# Altium schematic symbol library jlcpcb_2025_04_capacitors_extended_1210.schlib: 709 symbols (part 3 of 4)
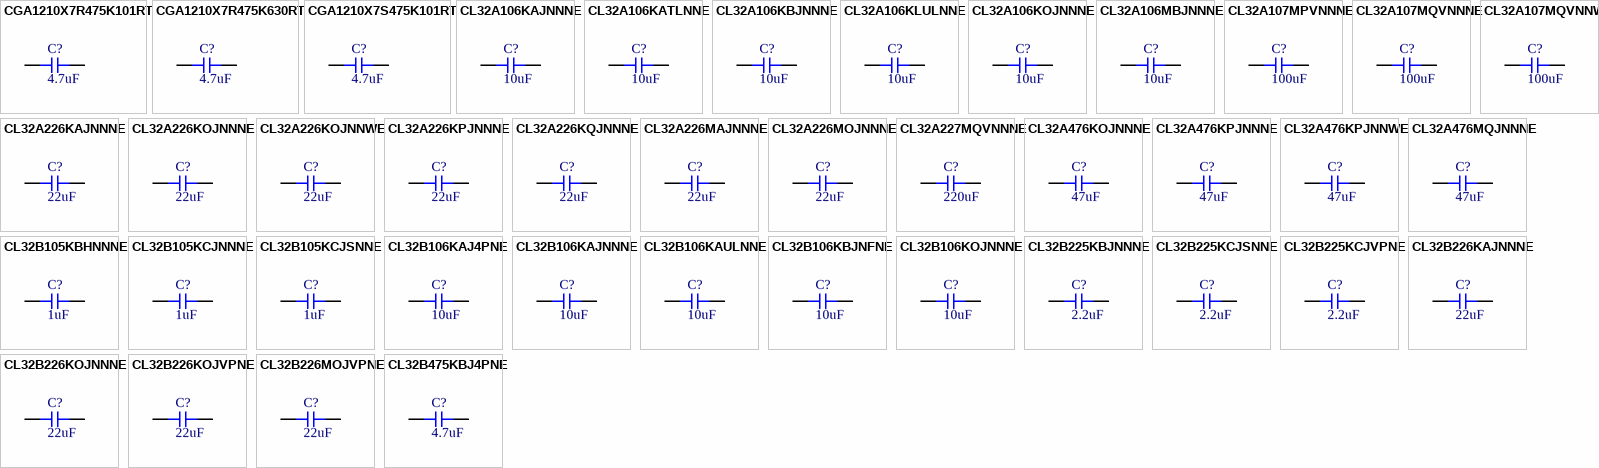
[diagram p19: symbols CGA1210X7R475K101RT to CL32B475KBJ4PNE]

## CL32A106KLULNNE
designator C?  Capacitance: 10uF  (hidden comment: *)
Capacitor, Ceramic (MLCC), 10uF, ±10%, 35V, X5R, ±10%, SMD 1210; Manufacturer: Samsung Electro-Mechanics; Manufacturer Part Number: CL32A106KLULNNE; Package Size: 1210; JLCPCB Basic Part: No; JLCPCB Part Number: C2980162; Supplier 1: LCSC; Category: Capacitors - MLCC; Supplier Part Number 1: C2980162; Tolerance: ±10%; Voltage Rating: 35V; Temperature Coefficient: X5R; RoHS: Yes; ComponentLink1Description: Datasheet; ComponentLink1URL: https://wmsc.lcsc.com/wmsc/upload/file/pdf/v2/lcsc/2203081130_Samsung-Electro-Mechanics-CL32A106KLULNNE_C2980162.pdf; ComponentLink2Description: JLCPCB Part URL; ComponentLink2URL: https://jlcpcb.com/partdetail/C2980162; ComponentLink3Description: LCSC Part URL; ComponentLink3URL: https://lcsc.com/product-detail/Multilayer-Ceramic-Capacitors-MLCC---SMD-SMT_Samsung-Electro-Mechanics-Samsung-Electro-Mechanics-CL32A106KLULNNE_C2980162.html; ComponentLink4Description: Samsung Component Library; ComponentLink4URL: https://weblib.samsungsem.com/mlcc/mlcc-ec.do?partNumber=CL32A106KLULNN
footprint CAP-1210 (1210 (3225M) Capacitor)
pins: 1, 2

## CL32A106KOJNNNE
designator C?  Capacitance: 10uF  (hidden comment: *)
Capacitor, Ceramic (MLCC), 10uF, ±10%, 16V, X5R, ±10%, SMD 1210; Manufacturer: Samsung Electro-Mechanics; Manufacturer Part Number: CL32A106KOJNNNE; Package Size: 1210; JLCPCB Basic Part: No; JLCPCB Part Number: C307584; Supplier 1: LCSC; Category: Capacitors - MLCC; Supplier Part Number 1: C307584; Tolerance: ±10%; Voltage Rating: 16V; Temperature Coefficient: X5R; RoHS: Yes; ComponentLink1Description: Datasheet; ComponentLink1URL: https://wmsc.lcsc.com/wmsc/upload/file/pdf/v2/lcsc/2304140030_Samsung-Electro-Mechanics-CL32A106KOJNNNE_C307584.pdf; ComponentLink2Description: JLCPCB Part URL; ComponentLink2URL: https://jlcpcb.com/partdetail/C307584; ComponentLink3Description: LCSC Part URL; ComponentLink3URL: https://lcsc.com/product-detail/Multilayer-Ceramic-Capacitors-MLCC---SMD-SMT_Samsung-Electro-Mechanics-Samsung-Electro-Mechanics-CL32A106KOJNNNE_C307584.html; ComponentLink4Description: Samsung Component Library; ComponentLink4URL: https://weblib.samsungsem.com/mlcc/mlcc-ec.do?partNumber=CL32A106KOJNNN
footprint CAP-1210 (1210 (3225M) Capacitor)
pins: 1, 2

## CL32A106MBJNNNE
designator C?  Capacitance: 10uF  (hidden comment: *)
Capacitor, Ceramic (MLCC), 10uF, ±20%, 50V, X5R, ±20%, SMD 1210; Manufacturer: Samsung Electro-Mechanics; Manufacturer Part Number: CL32A106MBJNNNE; Package Size: 1210; JLCPCB Basic Part: No; JLCPCB Part Number: C730495; Supplier 1: LCSC; Category: Capacitors - MLCC; Supplier Part Number 1: C730495; Tolerance: ±20%; Voltage Rating: 50V; Temperature Coefficient: X5R; RoHS: Yes; ComponentLink1Description: Datasheet; ComponentLink1URL: https://wmsc.lcsc.com/wmsc/upload/file/pdf/v2/lcsc/2008252037_Samsung-Electro-Mechanics-CL32A106MBJNNNE_C730495.pdf; ComponentLink2Description: JLCPCB Part URL; ComponentLink2URL: https://jlcpcb.com/partdetail/C730495; ComponentLink3Description: LCSC Part URL; ComponentLink3URL: https://lcsc.com/product-detail/Multilayer-Ceramic-Capacitors-MLCC---SMD-SMT_Samsung-Electro-Mechanics-Samsung-Electro-Mechanics-CL32A106MBJNNNE_C730495.html; ComponentLink4Description: Samsung Component Library; ComponentLink4URL: https://weblib.samsungsem.com/mlcc/mlcc-ec.do?partNumber=CL32A106MBJNNN
footprint CAP-1210 (1210 (3225M) Capacitor)
pins: 1, 2

## CL32A107MPVNNNE
designator C?  Capacitance: 100uF  (hidden comment: *)
Capacitor, Ceramic (MLCC), 100uF, ±20%, 10V, X5R, ±20%, SMD 1210; Manufacturer: Samsung Electro-Mechanics; Manufacturer Part Number: CL32A107MPVNNNE; Package Size: 1210; JLCPCB Basic Part: No; JLCPCB Part Number: C23742; Supplier 1: LCSC; Category: Capacitors - MLCC; Supplier Part Number 1: C23742; Tolerance: ±20%; Voltage Rating: 10V; Temperature Coefficient: X5R; RoHS: Yes; ComponentLink1Description: Datasheet; ComponentLink1URL: https://wmsc.lcsc.com/wmsc/upload/file/pdf/v2/lcsc/2304140030_Samsung-Electro-Mechanics-CL32A107MPVNNNE_C23742.pdf; ComponentLink2Description: JLCPCB Part URL; ComponentLink2URL: https://jlcpcb.com/partdetail/C23742; ComponentLink3Description: LCSC Part URL; ComponentLink3URL: https://lcsc.com/product-detail/Multilayer-Ceramic-Capacitors-MLCC---SMD-SMT_Samsung-Electro-Mechanics-Samsung-Electro-Mechanics-CL32A107MPVNNNE_C23742.html; ComponentLink4Description: Samsung Component Library; ComponentLink4URL: https://weblib.samsungsem.com/mlcc/mlcc-ec.do?partNumber=CL32A107MPVNNN
footprint CAP-1210 (1210 (3225M) Capacitor)
pins: 1, 2

## CL32A107MQVNNNE
designator C?  Capacitance: 100uF  (hidden comment: *)
Capacitor, Ceramic (MLCC), 100uF, ±20%, 6.3V, X5R, ±20%, SMD 1210; Manufacturer: Samsung Electro-Mechanics; Manufacturer Part Number: CL32A107MQVNNNE; Package Size: 1210; JLCPCB Basic Part: No; JLCPCB Part Number: C49066; Supplier 1: LCSC; Category: Capacitors - MLCC; Supplier Part Number 1: C49066; Tolerance: ±20%; Voltage Rating: 6.3V; Temperature Coefficient: X5R; RoHS: Yes; ComponentLink1Description: Datasheet; ComponentLink1URL: https://wmsc.lcsc.com/wmsc/upload/file/pdf/v2/lcsc/2304140030_Samsung-Electro-Mechanics-CL32A107MQVNNNE_C49066.pdf; ComponentLink2Description: JLCPCB Part URL; ComponentLink2URL: https://jlcpcb.com/partdetail/C49066; ComponentLink3Description: LCSC Part URL; ComponentLink3URL: https://lcsc.com/product-detail/Multilayer-Ceramic-Capacitors-MLCC---SMD-SMT_Samsung-Electro-Mechanics-Samsung-Electro-Mechanics-CL32A107MQVNNNE_C49066.html; ComponentLink4Description: Samsung Component Library; ComponentLink4URL: https://weblib.samsungsem.com/mlcc/mlcc-ec.do?partNumber=CL32A107MQVNNN
footprint CAP-1210 (1210 (3225M) Capacitor)
pins: 1, 2

## CL32A107MQVNNWE
designator C?  Capacitance: 100uF  (hidden comment: *)
Capacitor, Ceramic (MLCC), 100uF, ±20%, 6.3V, X5R, ±20%, SMD 1210; Manufacturer: Samsung Electro-Mechanics; Manufacturer Part Number: CL32A107MQVNNWE; Package Size: 1210; JLCPCB Basic Part: No; JLCPCB Part Number: C16196520; Supplier 1: LCSC; Category: Capacitors - MLCC; Supplier Part Number 1: C16196520; Tolerance: ±20%; Voltage Rating: 6.3V; Temperature Coefficient: X5R; RoHS: Yes; ComponentLink1Description: Datasheet; ComponentLink1URL: https://wmsc.lcsc.com/wmsc/upload/file/pdf/v2/lcsc/2309060914_Samsung-Electro-Mechanics-CL32A107MQVNNWE_C16196520.pdf; ComponentLink2Description: JLCPCB Part URL; ComponentLink2URL: https://jlcpcb.com/partdetail/C16196520; ComponentLink3Description: LCSC Part URL; ComponentLink3URL: https://lcsc.com/product-detail/Multilayer-Ceramic-Capacitors-MLCC---SMD-SMT_Samsung-Electro-Mechanics-Samsung-Electro-Mechanics-CL32A107MQVNNWE_C16196520.html; ComponentLink4Description: Samsung Component Library; ComponentLink4URL: https://weblib.samsungsem.com/mlcc/mlcc-ec.do?partNumber=CL32A107MQVNNW
footprint CAP-1210 (1210 (3225M) Capacitor)
pins: 1, 2

## CL32A226KAJNNNE
designator C?  Capacitance: 22uF  (hidden comment: *)
Capacitor, Ceramic (MLCC), 22uF, ±10%, 25V, X5R, ±10%, SMD 1210; Manufacturer: Samsung Electro-Mechanics; Manufacturer Part Number: CL32A226KAJNNNE; Package Size: 1210; JLCPCB Basic Part: No; JLCPCB Part Number: C52306; Supplier 1: LCSC; Category: Capacitors - MLCC; Supplier Part Number 1: C52306; Tolerance: ±10%; Voltage Rating: 25V; Temperature Coefficient: X5R; RoHS: Yes; ComponentLink1Description: Datasheet; ComponentLink1URL: https://wmsc.lcsc.com/wmsc/upload/file/pdf/v2/lcsc/2304140030_Samsung-Electro-Mechanics-CL32A226KAJNNNE_C52306.pdf; ComponentLink2Description: JLCPCB Part URL; ComponentLink2URL: https://jlcpcb.com/partdetail/C52306; ComponentLink3Description: LCSC Part URL; ComponentLink3URL: https://lcsc.com/product-detail/Multilayer-Ceramic-Capacitors-MLCC---SMD-SMT_Samsung-Electro-Mechanics-Samsung-Electro-Mechanics-CL32A226KAJNNNE_C52306.html; ComponentLink4Description: Samsung Component Library; ComponentLink4URL: https://weblib.samsungsem.com/mlcc/mlcc-ec.do?partNumber=CL32A226KAJNNN
footprint CAP-1210 (1210 (3225M) Capacitor)
pins: 1, 2

## CL32A226KOJNNNE
designator C?  Capacitance: 22uF  (hidden comment: *)
Capacitor, Ceramic (MLCC), 22uF, ±10%, 16V, X5R, ±10%, SMD 1210; Manufacturer: Samsung Electro-Mechanics; Manufacturer Part Number: CL32A226KOJNNNE; Package Size: 1210; JLCPCB Basic Part: No; JLCPCB Part Number: C19659; Supplier 1: LCSC; Category: Capacitors - MLCC; Supplier Part Number 1: C19659; Tolerance: ±10%; Voltage Rating: 16V; Temperature Coefficient: X5R; RoHS: Yes; ComponentLink1Description: Datasheet; ComponentLink1URL: https://wmsc.lcsc.com/wmsc/upload/file/pdf/v2/lcsc/2304140030_Samsung-Electro-Mechanics-CL32A226KOJNNNE_C19659.pdf; ComponentLink2Description: JLCPCB Part URL; ComponentLink2URL: https://jlcpcb.com/partdetail/C19659; ComponentLink3Description: LCSC Part URL; ComponentLink3URL: https://lcsc.com/product-detail/Multilayer-Ceramic-Capacitors-MLCC---SMD-SMT_Samsung-Electro-Mechanics-Samsung-Electro-Mechanics-CL32A226KOJNNNE_C19659.html; ComponentLink4Description: Samsung Component Library; ComponentLink4URL: https://weblib.samsungsem.com/mlcc/mlcc-ec.do?partNumber=CL32A226KOJNNN
footprint CAP-1210 (1210 (3225M) Capacitor)
pins: 1, 2

## CL32A226KOJNNWE
designator C?  Capacitance: 22uF  (hidden comment: *)
Capacitor, Ceramic (MLCC), 22uF, ±10%, 16V, X5R, ±10%, SMD 1210; Manufacturer: Samsung Electro-Mechanics; Manufacturer Part Number: CL32A226KOJNNWE; Package Size: 1210; JLCPCB Basic Part: No; JLCPCB Part Number: C368810; Supplier 1: LCSC; Category: Capacitors - MLCC; Supplier Part Number 1: C368810; Tolerance: ±10%; Voltage Rating: 16V; Temperature Coefficient: X5R; RoHS: Yes; ComponentLink1Description: Datasheet; ComponentLink1URL: https://wmsc.lcsc.com/wmsc/upload/file/pdf/v2/lcsc/2304140030_Samsung-Electro-Mechanics-CL32A226KOJNNWE_C368810.pdf; ComponentLink2Description: JLCPCB Part URL; ComponentLink2URL: https://jlcpcb.com/partdetail/C368810; ComponentLink3Description: LCSC Part URL; ComponentLink3URL: https://lcsc.com/product-detail/Multilayer-Ceramic-Capacitors-MLCC---SMD-SMT_Samsung-Electro-Mechanics-Samsung-Electro-Mechanics-CL32A226KOJNNWE_C368810.html; ComponentLink4Description: Samsung Component Library; ComponentLink4URL: https://weblib.samsungsem.com/mlcc/mlcc-ec.do?partNumber=CL32A226KOJNNW
footprint CAP-1210 (1210 (3225M) Capacitor)
pins: 1, 2

## CL32A226KPJNNNE
designator C?  Capacitance: 22uF  (hidden comment: *)
Capacitor, Ceramic (MLCC), 22uF, ±10%, 10V, X5R, ±10%, SMD 1210; Manufacturer: Samsung Electro-Mechanics; Manufacturer Part Number: CL32A226KPJNNNE; Package Size: 1210; JLCPCB Basic Part: No; JLCPCB Part Number: C318780; Supplier 1: LCSC; Category: Capacitors - MLCC; Supplier Part Number 1: C318780; Tolerance: ±10%; Voltage Rating: 10V; Temperature Coefficient: X5R; RoHS: Yes; ComponentLink1Description: Datasheet; ComponentLink1URL: https://wmsc.lcsc.com/wmsc/upload/file/pdf/v2/lcsc/1912111437_Samsung-Electro-Mechanics-CL32A226KPJNNNE_C318780.pdf; ComponentLink2Description: JLCPCB Part URL; ComponentLink2URL: https://jlcpcb.com/partdetail/C318780; ComponentLink3Description: LCSC Part URL; ComponentLink3URL: https://lcsc.com/product-detail/Multilayer-Ceramic-Capacitors-MLCC---SMD-SMT_Samsung-Electro-Mechanics-Samsung-Electro-Mechanics-CL32A226KPJNNNE_C318780.html; ComponentLink4Description: Samsung Component Library; ComponentLink4URL: https://weblib.samsungsem.com/mlcc/mlcc-ec.do?partNumber=CL32A226KPJNNN
footprint CAP-1210 (1210 (3225M) Capacitor)
pins: 1, 2

## CL32A226KQJNNNE
designator C?  Capacitance: 22uF  (hidden comment: *)
Capacitor, Ceramic (MLCC), 22uF, ±10%, 6.3V, X5R, ±10%, SMD 1210; Manufacturer: Samsung Electro-Mechanics; Manufacturer Part Number: CL32A226KQJNNNE; Package Size: 1210; JLCPCB Basic Part: No; JLCPCB Part Number: C307585; Supplier 1: LCSC; Category: Capacitors - MLCC; Supplier Part Number 1: C307585; Tolerance: ±10%; Voltage Rating: 6.3V; Temperature Coefficient: X5R; RoHS: Yes; ComponentLink1Description: Datasheet; ComponentLink1URL: https://wmsc.lcsc.com/wmsc/upload/file/pdf/v2/lcsc/2304140030_Samsung-Electro-Mechanics-CL32A226KQJNNNE_C307585.pdf; ComponentLink2Description: JLCPCB Part URL; ComponentLink2URL: https://jlcpcb.com/partdetail/C307585; ComponentLink3Description: LCSC Part URL; ComponentLink3URL: https://lcsc.com/product-detail/Multilayer-Ceramic-Capacitors-MLCC---SMD-SMT_Samsung-Electro-Mechanics-Samsung-Electro-Mechanics-CL32A226KQJNNNE_C307585.html; ComponentLink4Description: Samsung Component Library; ComponentLink4URL: https://weblib.samsungsem.com/mlcc/mlcc-ec.do?partNumber=CL32A226KQJNNN
footprint CAP-1210 (1210 (3225M) Capacitor)
pins: 1, 2

## CL32A226MAJNNNE
designator C?  Capacitance: 22uF  (hidden comment: *)
Capacitor, Ceramic (MLCC), 22uF, ±20%, 25V, X5R, ±20%, SMD 1210; Manufacturer: Samsung Electro-Mechanics; Manufacturer Part Number: CL32A226MAJNNNE; Package Size: 1210; JLCPCB Basic Part: No; JLCPCB Part Number: C307586; Supplier 1: LCSC; Category: Capacitors - MLCC; Supplier Part Number 1: C307586; Tolerance: ±20%; Voltage Rating: 25V; Temperature Coefficient: X5R; RoHS: Yes; ComponentLink1Description: Datasheet; ComponentLink1URL: https://wmsc.lcsc.com/wmsc/upload/file/pdf/v2/lcsc/2304140030_Samsung-Electro-Mechanics-CL32A226MAJNNNE_C307586.pdf; ComponentLink2Description: JLCPCB Part URL; ComponentLink2URL: https://jlcpcb.com/partdetail/C307586; ComponentLink3Description: LCSC Part URL; ComponentLink3URL: https://lcsc.com/product-detail/Multilayer-Ceramic-Capacitors-MLCC---SMD-SMT_Samsung-Electro-Mechanics-Samsung-Electro-Mechanics-CL32A226MAJNNNE_C307586.html; ComponentLink4Description: Samsung Component Library; ComponentLink4URL: https://weblib.samsungsem.com/mlcc/mlcc-ec.do?partNumber=CL32A226MAJNNN
footprint CAP-1210 (1210 (3225M) Capacitor)
pins: 1, 2

## CL32A226MOJNNNE
designator C?  Capacitance: 22uF  (hidden comment: *)
Capacitor, Ceramic (MLCC), 22uF, ±20%, 16V, X5R, ±20%, SMD 1210; Manufacturer: Samsung Electro-Mechanics; Manufacturer Part Number: CL32A226MOJNNNE; Package Size: 1210; JLCPCB Basic Part: No; JLCPCB Part Number: C100086; Supplier 1: LCSC; Category: Capacitors - MLCC; Supplier Part Number 1: C100086; Tolerance: ±20%; Voltage Rating: 16V; Temperature Coefficient: X5R; RoHS: Yes; ComponentLink1Description: Datasheet; ComponentLink1URL: https://wmsc.lcsc.com/wmsc/upload/file/pdf/v2/lcsc/2304140030_Samsung-Electro-Mechanics-CL32A226MOJNNNE_C100086.pdf; ComponentLink2Description: JLCPCB Part URL; ComponentLink2URL: https://jlcpcb.com/partdetail/C100086; ComponentLink3Description: LCSC Part URL; ComponentLink3URL: https://lcsc.com/product-detail/Multilayer-Ceramic-Capacitors-MLCC---SMD-SMT_Samsung-Electro-Mechanics-Samsung-Electro-Mechanics-CL32A226MOJNNNE_C100086.html; ComponentLink4Description: Samsung Component Library; ComponentLink4URL: https://weblib.samsungsem.com/mlcc/mlcc-ec.do?partNumber=CL32A226MOJNNN
footprint CAP-1210 (1210 (3225M) Capacitor)
pins: 1, 2

## CL32A227MQVNNNE
designator C?  Capacitance: 220uF  (hidden comment: *)
Capacitor, Ceramic (MLCC), 220uF, ±20%, 6.3V, X5R, ±20%, SMD 1210; Manufacturer: Samsung Electro-Mechanics; Manufacturer Part Number: CL32A227MQVNNNE; Package Size: 1210; JLCPCB Basic Part: No; JLCPCB Part Number: C400951; Supplier 1: LCSC; Category: Capacitors - MLCC; Supplier Part Number 1: C400951; Tolerance: ±20%; Voltage Rating: 6.3V; Temperature Coefficient: X5R; RoHS: Yes; ComponentLink1Description: Datasheet; ComponentLink1URL: https://wmsc.lcsc.com/wmsc/upload/file/pdf/v2/lcsc/2301301130_Samsung-Electro-Mechanics-CL32A227MQVNNNE_C400951.pdf; ComponentLink2Description: JLCPCB Part URL; ComponentLink2URL: https://jlcpcb.com/partdetail/C400951; ComponentLink3Description: LCSC Part URL; ComponentLink3URL: https://lcsc.com/product-detail/Multilayer-Ceramic-Capacitors-MLCC---SMD-SMT_Samsung-Electro-Mechanics-Samsung-Electro-Mechanics-CL32A227MQVNNNE_C400951.html; ComponentLink4Description: Samsung Component Library; ComponentLink4URL: https://weblib.samsungsem.com/mlcc/mlcc-ec.do?partNumber=CL32A227MQVNNN
footprint CAP-1210 (1210 (3225M) Capacitor)
pins: 1, 2

## CL32A476KOJNNNE
designator C?  Capacitance: 47uF  (hidden comment: *)
Capacitor, Ceramic (MLCC), 47uF, ±10%, 16V, X5R, ±10%, SMD 1210; Manufacturer: Samsung Electro-Mechanics; Manufacturer Part Number: CL32A476KOJNNNE; Package Size: 1210; JLCPCB Basic Part: No; JLCPCB Part Number: C2932477; Supplier 1: LCSC; Category: Capacitors - MLCC; Supplier Part Number 1: C2932477; Tolerance: ±10%; Voltage Rating: 16V; Temperature Coefficient: X5R; RoHS: Yes; ComponentLink1Description: Datasheet; ComponentLink1URL: https://wmsc.lcsc.com/wmsc/upload/file/pdf/v2/lcsc/2201121530_Samsung-Electro-Mechanics-CL32A476KOJNNNE_C2932477.pdf; ComponentLink2Description: JLCPCB Part URL; ComponentLink2URL: https://jlcpcb.com/partdetail/C2932477; ComponentLink3Description: LCSC Part URL; ComponentLink3URL: https://lcsc.com/product-detail/Multilayer-Ceramic-Capacitors-MLCC---SMD-SMT_Samsung-Electro-Mechanics-Samsung-Electro-Mechanics-CL32A476KOJNNNE_C2932477.html; ComponentLink4Description: Samsung Component Library; ComponentLink4URL: https://weblib.samsungsem.com/mlcc/mlcc-ec.do?partNumber=CL32A476KOJNNN
footprint CAP-1210 (1210 (3225M) Capacitor)
pins: 1, 2

## CL32A476KPJNNNE
designator C?  Capacitance: 47uF  (hidden comment: *)
Capacitor, Ceramic (MLCC), 47uF, ±10%, 10V, X5R, ±10%, SMD 1210; Manufacturer: Samsung Electro-Mechanics; Manufacturer Part Number: CL32A476KPJNNNE; Package Size: 1210; JLCPCB Basic Part: No; JLCPCB Part Number: C525654; Supplier 1: LCSC; Category: Capacitors - MLCC; Supplier Part Number 1: C525654; Tolerance: ±10%; Voltage Rating: 10V; Temperature Coefficient: X5R; RoHS: Yes; ComponentLink1Description: Datasheet; ComponentLink1URL: https://wmsc.lcsc.com/wmsc/upload/file/pdf/v2/lcsc/2304140030_Samsung-Electro-Mechanics-CL32A476KPJNNNE_C525654.pdf; ComponentLink2Description: JLCPCB Part URL; ComponentLink2URL: https://jlcpcb.com/partdetail/C525654; ComponentLink3Description: LCSC Part URL; ComponentLink3URL: https://lcsc.com/product-detail/Multilayer-Ceramic-Capacitors-MLCC---SMD-SMT_Samsung-Electro-Mechanics-Samsung-Electro-Mechanics-CL32A476KPJNNNE_C525654.html; ComponentLink4Description: Samsung Component Library; ComponentLink4URL: https://weblib.samsungsem.com/mlcc/mlcc-ec.do?partNumber=CL32A476KPJNNN
footprint CAP-1210 (1210 (3225M) Capacitor)
pins: 1, 2

## CL32A476KPJNNWE
designator C?  Capacitance: 47uF  (hidden comment: *)
Capacitor, Ceramic (MLCC), 47uF, ±10%, 10V, X5R, ±10%, SMD 1210; Manufacturer: Samsung Electro-Mechanics; Manufacturer Part Number: CL32A476KPJNNWE; Package Size: 1210; JLCPCB Basic Part: No; JLCPCB Part Number: C730499; Supplier 1: LCSC; Category: Capacitors - MLCC; Supplier Part Number 1: C730499; Tolerance: ±10%; Voltage Rating: 10V; Temperature Coefficient: X5R; RoHS: Yes; ComponentLink1Description: Datasheet; ComponentLink1URL: https://wmsc.lcsc.com/wmsc/upload/file/pdf/v2/lcsc/2304140030_Samsung-Electro-Mechanics-CL32A476KPJNNWE_C730499.pdf; ComponentLink2Description: JLCPCB Part URL; ComponentLink2URL: https://jlcpcb.com/partdetail/C730499; ComponentLink3Description: LCSC Part URL; ComponentLink3URL: https://lcsc.com/product-detail/Multilayer-Ceramic-Capacitors-MLCC---SMD-SMT_Samsung-Electro-Mechanics-Samsung-Electro-Mechanics-CL32A476KPJNNWE_C730499.html; ComponentLink4Description: Samsung Component Library; ComponentLink4URL: https://weblib.samsungsem.com/mlcc/mlcc-ec.do?partNumber=CL32A476KPJNNW
footprint CAP-1210 (1210 (3225M) Capacitor)
pins: 1, 2

## CL32A476MQJNNNE
designator C?  Capacitance: 47uF  (hidden comment: *)
Capacitor, Ceramic (MLCC), 47uF, ±20%, 6.3V, X5R, ±20%, SMD 1210; Manufacturer: Samsung Electro-Mechanics; Manufacturer Part Number: CL32A476MQJNNNE; Package Size: 1210; JLCPCB Basic Part: No; JLCPCB Part Number: C318779; Supplier 1: LCSC; Category: Capacitors - MLCC; Supplier Part Number 1: C318779; Tolerance: ±20%; Voltage Rating: 6.3V; Temperature Coefficient: X5R; RoHS: Yes; ComponentLink1Description: Datasheet; ComponentLink1URL: https://wmsc.lcsc.com/wmsc/upload/file/pdf/v2/lcsc/2304140030_Samsung-Electro-Mechanics-CL32A476MQJNNNE_C318779.pdf; ComponentLink2Description: JLCPCB Part URL; ComponentLink2URL: https://jlcpcb.com/partdetail/C318779; ComponentLink3Description: LCSC Part URL; ComponentLink3URL: https://lcsc.com/product-detail/Multilayer-Ceramic-Capacitors-MLCC---SMD-SMT_Samsung-Electro-Mechanics-Samsung-Electro-Mechanics-CL32A476MQJNNNE_C318779.html; ComponentLink4Description: Samsung Component Library; ComponentLink4URL: https://weblib.samsungsem.com/mlcc/mlcc-ec.do?partNumber=CL32A476MQJNNN
footprint CAP-1210 (1210 (3225M) Capacitor)
pins: 1, 2

## CL32B105KBHNNNE
designator C?  Capacitance: 1uF  (hidden comment: *)
Capacitor, Ceramic (MLCC), 1uF, ±10%, 50V, X7R, ±10%, SMD 1210; Manufacturer: Samsung Electro-Mechanics; Manufacturer Part Number: CL32B105KBHNNNE; Package Size: 1210; JLCPCB Basic Part: No; JLCPCB Part Number: C40708; Supplier 1: LCSC; Category: Capacitors - MLCC; Supplier Part Number 1: C40708; Tolerance: ±10%; Voltage Rating: 50V; Temperature Coefficient: X7R; RoHS: Yes; ComponentLink1Description: Datasheet; ComponentLink1URL: https://wmsc.lcsc.com/wmsc/upload/file/pdf/v2/lcsc/2304140030_Samsung-Electro-Mechanics-CL32B105KBHNNNE_C40708.pdf; ComponentLink2Description: JLCPCB Part URL; ComponentLink2URL: https://jlcpcb.com/partdetail/C40708; ComponentLink3Description: LCSC Part URL; ComponentLink3URL: https://lcsc.com/product-detail/Multilayer-Ceramic-Capacitors-MLCC---SMD-SMT_Samsung-Electro-Mechanics-Samsung-Electro-Mechanics-CL32B105KBHNNNE_C40708.html; ComponentLink4Description: Samsung Component Library; ComponentLink4URL: https://weblib.samsungsem.com/mlcc/mlcc-ec.do?partNumber=CL32B105KBHNNN
footprint CAP-1210 (1210 (3225M) Capacitor)
pins: 1, 2

## CL32B105KCJNNNE
designator C?  Capacitance: 1uF  (hidden comment: *)
Capacitor, Ceramic (MLCC), 1uF, ±10%, 100V, X7R, ±10%, SMD 1210; Manufacturer: Samsung Electro-Mechanics; Manufacturer Part Number: CL32B105KCJNNNE; Package Size: 1210; JLCPCB Basic Part: No; JLCPCB Part Number: C444847; Supplier 1: LCSC; Category: Capacitors - MLCC; Supplier Part Number 1: C444847; Tolerance: ±10%; Voltage Rating: 100V; Temperature Coefficient: X7R; RoHS: Yes; ComponentLink1Description: Datasheet; ComponentLink1URL: https://wmsc.lcsc.com/wmsc/upload/file/pdf/v2/lcsc/2304140030_Samsung-Electro-Mechanics-CL32B105KCJNNNE_C444847.pdf; ComponentLink2Description: JLCPCB Part URL; ComponentLink2URL: https://jlcpcb.com/partdetail/C444847; ComponentLink3Description: LCSC Part URL; ComponentLink3URL: https://lcsc.com/product-detail/Multilayer-Ceramic-Capacitors-MLCC---SMD-SMT_Samsung-Electro-Mechanics-Samsung-Electro-Mechanics-CL32B105KCJNNNE_C444847.html; ComponentLink4Description: Samsung Component Library; ComponentLink4URL: https://weblib.samsungsem.com/mlcc/mlcc-ec.do?partNumber=CL32B105KCJNNN
footprint CAP-1210 (1210 (3225M) Capacitor)
pins: 1, 2

## CL32B105KCJSNNE
designator C?  Capacitance: 1uF  (hidden comment: *)
Capacitor, Ceramic (MLCC), 1uF, ±10%, 100V, X7R, ±10%, SMD 1210; Manufacturer: Samsung Electro-Mechanics; Manufacturer Part Number: CL32B105KCJSNNE; Package Size: 1210; JLCPCB Basic Part: No; JLCPCB Part Number: C159746; Supplier 1: LCSC; Category: Capacitors - MLCC; Supplier Part Number 1: C159746; Tolerance: ±10%; Voltage Rating: 100V; Temperature Coefficient: X7R; RoHS: Yes; ComponentLink1Description: Datasheet; ComponentLink1URL: https://wmsc.lcsc.com/wmsc/upload/file/pdf/v2/lcsc/2304140030_Samsung-Electro-Mechanics-CL32B105KCJSNNE_C159746.pdf; ComponentLink2Description: JLCPCB Part URL; ComponentLink2URL: https://jlcpcb.com/partdetail/C159746; ComponentLink3Description: LCSC Part URL; ComponentLink3URL: https://lcsc.com/product-detail/Multilayer-Ceramic-Capacitors-MLCC---SMD-SMT_Samsung-Electro-Mechanics-Samsung-Electro-Mechanics-CL32B105KCJSNNE_C159746.html; ComponentLink4Description: Samsung Component Library; ComponentLink4URL: https://weblib.samsungsem.com/mlcc/mlcc-ec.do?partNumber=CL32B105KCJSNN
footprint CAP-1210 (1210 (3225M) Capacitor)
pins: 1, 2

## CL32B106KAJ4PNE
designator C?  Capacitance: 10uF  (hidden comment: *)
Capacitor, Ceramic (MLCC), 10uF, ±10%, 25V, X7R, ±10%, SMD 1210; Manufacturer: Samsung Electro-Mechanics; Manufacturer Part Number: CL32B106KAJ4PNE; Package Size: 1210; JLCPCB Basic Part: No; JLCPCB Part Number: C472857; Supplier 1: LCSC; Category: Capacitors - MLCC; Supplier Part Number 1: C472857; Tolerance: ±10%; Voltage Rating: 25V; Temperature Coefficient: X7R; RoHS: Yes; ComponentLink1Description: Datasheet; ComponentLink1URL: https://wmsc.lcsc.com/wmsc/upload/file/pdf/v2/lcsc/2304140030_Samsung-Electro-Mechanics-CL32B106KAJ4PNE_C472857.pdf; ComponentLink2Description: JLCPCB Part URL; ComponentLink2URL: https://jlcpcb.com/partdetail/C472857; ComponentLink3Description: LCSC Part URL; ComponentLink3URL: https://lcsc.com/product-detail/Multilayer-Ceramic-Capacitors-MLCC---SMD-SMT_Samsung-Electro-Mechanics-Samsung-Electro-Mechanics-CL32B106KAJ4PNE_C472857.html; ComponentLink4Description: Samsung Component Library; ComponentLink4URL: https://weblib.samsungsem.com/mlcc/mlcc-ec.do?partNumber=CL32B106KAJ4PN
footprint CAP-1210 (1210 (3225M) Capacitor)
pins: 1, 2

## CL32B106KAJNNNE
designator C?  Capacitance: 10uF  (hidden comment: *)
Capacitor, Ceramic (MLCC), 10uF, ±10%, 25V, X7R, ±10%, SMD 1210; Manufacturer: Samsung Electro-Mechanics; Manufacturer Part Number: CL32B106KAJNNNE; Package Size: 1210; JLCPCB Basic Part: No; JLCPCB Part Number: C39232; Supplier 1: LCSC; Category: Capacitors - MLCC; Supplier Part Number 1: C39232; Tolerance: ±10%; Voltage Rating: 25V; Temperature Coefficient: X7R; RoHS: Yes; ComponentLink1Description: Datasheet; ComponentLink1URL: https://wmsc.lcsc.com/wmsc/upload/file/pdf/v2/lcsc/2304140030_Samsung-Electro-Mechanics-CL32B106KAJNNNE_C39232.pdf; ComponentLink2Description: JLCPCB Part URL; ComponentLink2URL: https://jlcpcb.com/partdetail/C39232; ComponentLink3Description: LCSC Part URL; ComponentLink3URL: https://lcsc.com/product-detail/Multilayer-Ceramic-Capacitors-MLCC---SMD-SMT_Samsung-Electro-Mechanics-Samsung-Electro-Mechanics-CL32B106KAJNNNE_C39232.html; ComponentLink4Description: Samsung Component Library; ComponentLink4URL: https://weblib.samsungsem.com/mlcc/mlcc-ec.do?partNumber=CL32B106KAJNNN
footprint CAP-1210 (1210 (3225M) Capacitor)
pins: 1, 2

## CL32B106KAULNNE
designator C?  Capacitance: 10uF  (hidden comment: *)
Capacitor, Ceramic (MLCC), 10uF, ±10%, 25V, X7R, ±10%, SMD 1210; Manufacturer: Samsung Electro-Mechanics; Manufacturer Part Number: CL32B106KAULNNE; Package Size: 1210; JLCPCB Basic Part: No; JLCPCB Part Number: C318781; Supplier 1: LCSC; Category: Capacitors - MLCC; Supplier Part Number 1: C318781; Tolerance: ±10%; Voltage Rating: 25V; Temperature Coefficient: X7R; RoHS: Yes; ComponentLink1Description: Datasheet; ComponentLink1URL: https://wmsc.lcsc.com/wmsc/upload/file/pdf/v2/lcsc/2304140030_Samsung-Electro-Mechanics-CL32B106KAULNNE_C318781.pdf; ComponentLink2Description: JLCPCB Part URL; ComponentLink2URL: https://jlcpcb.com/partdetail/C318781; ComponentLink3Description: LCSC Part URL; ComponentLink3URL: https://lcsc.com/product-detail/Multilayer-Ceramic-Capacitors-MLCC---SMD-SMT_Samsung-Electro-Mechanics-Samsung-Electro-Mechanics-CL32B106KAULNNE_C318781.html; ComponentLink4Description: Samsung Component Library; ComponentLink4URL: https://weblib.samsungsem.com/mlcc/mlcc-ec.do?partNumber=CL32B106KAULNN
footprint CAP-1210 (1210 (3225M) Capacitor)
pins: 1, 2

## CL32B106KBJNFNE
designator C?  Capacitance: 10uF  (hidden comment: *)
Capacitor, Ceramic (MLCC), 10uF, ±10%, 50V, X7R, ±10%, SMD 1210; Manufacturer: Samsung Electro-Mechanics; Manufacturer Part Number: CL32B106KBJNFNE; Package Size: 1210; JLCPCB Basic Part: No; JLCPCB Part Number: C18739; Supplier 1: LCSC; Category: Capacitors - MLCC; Supplier Part Number 1: C18739; Tolerance: ±10%; Voltage Rating: 50V; Temperature Coefficient: X7R; RoHS: Yes; ComponentLink1Description: Datasheet; ComponentLink1URL: https://wmsc.lcsc.com/wmsc/upload/file/pdf/v2/lcsc/2304140030_Samsung-Electro-Mechanics-CL32B106KBJNFNE_C18739.pdf; ComponentLink2Description: JLCPCB Part URL; ComponentLink2URL: https://jlcpcb.com/partdetail/C18739; ComponentLink3Description: LCSC Part URL; ComponentLink3URL: https://lcsc.com/product-detail/Multilayer-Ceramic-Capacitors-MLCC---SMD-SMT_Samsung-Electro-Mechanics-Samsung-Electro-Mechanics-CL32B106KBJNFNE_C18739.html; ComponentLink4Description: Samsung Component Library; ComponentLink4URL: https://weblib.samsungsem.com/mlcc/mlcc-ec.do?partNumber=CL32B106KBJNFN
footprint CAP-1210 (1210 (3225M) Capacitor)
pins: 1, 2

## CL32B106KOJNNNE
designator C?  Capacitance: 10uF  (hidden comment: *)
Capacitor, Ceramic (MLCC), 10uF, ±10%, 16V, X7R, ±10%, SMD 1210; Manufacturer: Samsung Electro-Mechanics; Manufacturer Part Number: CL32B106KOJNNNE; Package Size: 1210; JLCPCB Basic Part: No; JLCPCB Part Number: C318782; Supplier 1: LCSC; Category: Capacitors - MLCC; Supplier Part Number 1: C318782; Tolerance: ±10%; Voltage Rating: 16V; Temperature Coefficient: X7R; RoHS: Yes; ComponentLink1Description: Datasheet; ComponentLink1URL: https://wmsc.lcsc.com/wmsc/upload/file/pdf/v2/lcsc/2304140030_Samsung-Electro-Mechanics-CL32B106KOJNNNE_C318782.pdf; ComponentLink2Description: JLCPCB Part URL; ComponentLink2URL: https://jlcpcb.com/partdetail/C318782; ComponentLink3Description: LCSC Part URL; ComponentLink3URL: https://lcsc.com/product-detail/Multilayer-Ceramic-Capacitors-MLCC---SMD-SMT_Samsung-Electro-Mechanics-Samsung-Electro-Mechanics-CL32B106KOJNNNE_C318782.html; ComponentLink4Description: Samsung Component Library; ComponentLink4URL: https://weblib.samsungsem.com/mlcc/mlcc-ec.do?partNumber=CL32B106KOJNNN
footprint CAP-1210 (1210 (3225M) Capacitor)
pins: 1, 2

## CL32B225KBJNNNE
designator C?  Capacitance: 2.2uF  (hidden comment: *)
Capacitor, Ceramic (MLCC), 2.2uF, ±10%, 50V, X7R, ±10%, SMD 1210; Manufacturer: Samsung Electro-Mechanics; Manufacturer Part Number: CL32B225KBJNNNE; Package Size: 1210; JLCPCB Basic Part: No; JLCPCB Part Number: C307587; Supplier 1: LCSC; Category: Capacitors - MLCC; Supplier Part Number 1: C307587; Tolerance: ±10%; Voltage Rating: 50V; Temperature Coefficient: X7R; RoHS: Yes; ComponentLink1Description: Datasheet; ComponentLink2Description: JLCPCB Part URL; ComponentLink2URL: https://jlcpcb.com/partdetail/C307587; ComponentLink3Description: LCSC Part URL; ComponentLink3URL: https://lcsc.com/product-detail/Multilayer-Ceramic-Capacitors-MLCC---SMD-SMT_Samsung-Electro-Mechanics-Samsung-Electro-Mechanics-CL32B225KBJNNNE_C307587.html; ComponentLink4Description: Samsung Component Library; ComponentLink4URL: https://weblib.samsungsem.com/mlcc/mlcc-ec.do?partNumber=CL32B225KBJNNN
footprint CAP-1210 (1210 (3225M) Capacitor)
pins: 1, 2

## CL32B225KCJSNNE
designator C?  Capacitance: 2.2uF  (hidden comment: *)
Capacitor, Ceramic (MLCC), 2.2uF, ±10%, 100V, X7R, ±10%, SMD 1210; Manufacturer: Samsung Electro-Mechanics; Manufacturer Part Number: CL32B225KCJSNNE; Package Size: 1210; JLCPCB Basic Part: No; JLCPCB Part Number: C55151; Supplier 1: LCSC; Category: Capacitors - MLCC; Supplier Part Number 1: C55151; Tolerance: ±10%; Voltage Rating: 100V; Temperature Coefficient: X7R; RoHS: Yes; ComponentLink1Description: Datasheet; ComponentLink1URL: https://wmsc.lcsc.com/wmsc/upload/file/pdf/v2/lcsc/2304140030_Samsung-Electro-Mechanics-CL32B225KCJSNNE_C55151.pdf; ComponentLink2Description: JLCPCB Part URL; ComponentLink2URL: https://jlcpcb.com/partdetail/C55151; ComponentLink3Description: LCSC Part URL; ComponentLink3URL: https://lcsc.com/product-detail/Multilayer-Ceramic-Capacitors-MLCC---SMD-SMT_Samsung-Electro-Mechanics-Samsung-Electro-Mechanics-CL32B225KCJSNNE_C55151.html; ComponentLink4Description: Samsung Component Library; ComponentLink4URL: https://weblib.samsungsem.com/mlcc/mlcc-ec.do?partNumber=CL32B225KCJSNN
footprint CAP-1210 (1210 (3225M) Capacitor)
pins: 1, 2

## CL32B225KCJVPNE
designator C?  Capacitance: 2.2uF  (hidden comment: *)
Capacitor, Ceramic (MLCC), 2.2uF, ±10%, 100V, X7R, ±10%, SMD 1210; Manufacturer: Samsung Electro-Mechanics; Manufacturer Part Number: CL32B225KCJVPNE; Package Size: 1210; JLCPCB Basic Part: No; JLCPCB Part Number: C2803392; Supplier 1: LCSC; Category: Capacitors - MLCC; Supplier Part Number 1: C2803392; Tolerance: ±10%; Voltage Rating: 100V; Temperature Coefficient: X7R; RoHS: Yes; ComponentLink1Description: Datasheet; ComponentLink1URL: https://wmsc.lcsc.com/wmsc/upload/file/pdf/v2/lcsc/2304140030_Samsung-Electro-Mechanics-CL32B225KCJVPNE_C2803392.pdf; ComponentLink2Description: JLCPCB Part URL; ComponentLink2URL: https://jlcpcb.com/partdetail/C2803392; ComponentLink3Description: LCSC Part URL; ComponentLink3URL: https://lcsc.com/product-detail/Multilayer-Ceramic-Capacitors-MLCC---SMD-SMT_Samsung-Electro-Mechanics-Samsung-Electro-Mechanics-CL32B225KCJVPNE_C2803392.html; ComponentLink4Description: Samsung Component Library; ComponentLink4URL: https://weblib.samsungsem.com/mlcc/mlcc-ec.do?partNumber=CL32B225KCJVPN
footprint CAP-1210 (1210 (3225M) Capacitor)
pins: 1, 2

## CL32B226KAJNNNE
designator C?  Capacitance: 22uF  (hidden comment: *)
Capacitor, Ceramic (MLCC), 22uF, ±10%, 25V, X7R, ±10%, SMD 1210; Manufacturer: Samsung Electro-Mechanics; Manufacturer Part Number: CL32B226KAJNNNE; Package Size: 1210; JLCPCB Basic Part: No; JLCPCB Part Number: C309062; Supplier 1: LCSC; Category: Capacitors - MLCC; Supplier Part Number 1: C309062; Tolerance: ±10%; Voltage Rating: 25V; Temperature Coefficient: X7R; RoHS: Yes; ComponentLink1Description: Datasheet; ComponentLink1URL: https://wmsc.lcsc.com/wmsc/upload/file/pdf/v2/lcsc/2304140030_Samsung-Electro-Mechanics-CL32B226KAJNNNE_C309062.pdf; ComponentLink2Description: JLCPCB Part URL; ComponentLink2URL: https://jlcpcb.com/partdetail/C309062; ComponentLink3Description: LCSC Part URL; ComponentLink3URL: https://lcsc.com/product-detail/Multilayer-Ceramic-Capacitors-MLCC---SMD-SMT_Samsung-Electro-Mechanics-Samsung-Electro-Mechanics-CL32B226KAJNNNE_C309062.html; ComponentLink4Description: Samsung Component Library; ComponentLink4URL: https://weblib.samsungsem.com/mlcc/mlcc-ec.do?partNumber=CL32B226KAJNNN
footprint CAP-1210 (1210 (3225M) Capacitor)
pins: 1, 2

## CL32B226KOJNNNE
designator C?  Capacitance: 22uF  (hidden comment: *)
Capacitor, Ceramic (MLCC), 22uF, ±10%, 16V, X7R, ±10%, SMD 1210; Manufacturer: Samsung Electro-Mechanics; Manufacturer Part Number: CL32B226KOJNNNE; Package Size: 1210; JLCPCB Basic Part: No; JLCPCB Part Number: C55530; Supplier 1: LCSC; Category: Capacitors - MLCC; Supplier Part Number 1: C55530; Tolerance: ±10%; Voltage Rating: 16V; Temperature Coefficient: X7R; RoHS: Yes; ComponentLink1Description: Datasheet; ComponentLink1URL: https://wmsc.lcsc.com/wmsc/upload/file/pdf/v2/lcsc/2304140030_Samsung-Electro-Mechanics-CL32B226KOJNNNE_C55530.pdf; ComponentLink2Description: JLCPCB Part URL; ComponentLink2URL: https://jlcpcb.com/partdetail/C55530; ComponentLink3Description: LCSC Part URL; ComponentLink3URL: https://lcsc.com/product-detail/Multilayer-Ceramic-Capacitors-MLCC---SMD-SMT_Samsung-Electro-Mechanics-Samsung-Electro-Mechanics-CL32B226KOJNNNE_C55530.html; ComponentLink4Description: Samsung Component Library; ComponentLink4URL: https://weblib.samsungsem.com/mlcc/mlcc-ec.do?partNumber=CL32B226KOJNNN
footprint CAP-1210 (1210 (3225M) Capacitor)
pins: 1, 2

## CL32B226KOJVPNE
designator C?  Capacitance: 22uF  (hidden comment: *)
Capacitor, Ceramic (MLCC), 22uF, ±10%, 16V, X7R, ±10%, SMD 1210; Manufacturer: Samsung Electro-Mechanics; Manufacturer Part Number: CL32B226KOJVPNE; Package Size: 1210; JLCPCB Basic Part: No; JLCPCB Part Number: C472858; Supplier 1: LCSC; Category: Capacitors - MLCC; Supplier Part Number 1: C472858; Tolerance: ±10%; Voltage Rating: 16V; Temperature Coefficient: X7R; RoHS: Yes; ComponentLink1Description: Datasheet; ComponentLink1URL: https://wmsc.lcsc.com/wmsc/upload/file/pdf/v2/lcsc/2304140030_Samsung-Electro-Mechanics-CL32B226KOJVPNE_C472858.pdf; ComponentLink2Description: JLCPCB Part URL; ComponentLink2URL: https://jlcpcb.com/partdetail/C472858; ComponentLink3Description: LCSC Part URL; ComponentLink3URL: https://lcsc.com/product-detail/Multilayer-Ceramic-Capacitors-MLCC---SMD-SMT_Samsung-Electro-Mechanics-Samsung-Electro-Mechanics-CL32B226KOJVPNE_C472858.html; ComponentLink4Description: Samsung Component Library; ComponentLink4URL: https://weblib.samsungsem.com/mlcc/mlcc-ec.do?partNumber=CL32B226KOJVPN
footprint CAP-1210 (1210 (3225M) Capacitor)
pins: 1, 2

## CL32B226MOJVPNE
designator C?  Capacitance: 22uF  (hidden comment: *)
Capacitor, Ceramic (MLCC), 22uF, ±20%, 16V, X7R, ±20%, SMD 1210; Manufacturer: Samsung Electro-Mechanics; Manufacturer Part Number: CL32B226MOJVPNE; Package Size: 1210; JLCPCB Basic Part: No; JLCPCB Part Number: C472859; Supplier 1: LCSC; Category: Capacitors - MLCC; Supplier Part Number 1: C472859; Tolerance: ±20%; Voltage Rating: 16V; Temperature Coefficient: X7R; RoHS: Yes; ComponentLink1Description: Datasheet; ComponentLink1URL: https://wmsc.lcsc.com/wmsc/upload/file/pdf/v2/lcsc/2304140030_Samsung-Electro-Mechanics-CL32B226MOJVPNE_C472859.pdf; ComponentLink2Description: JLCPCB Part URL; ComponentLink2URL: https://jlcpcb.com/partdetail/C472859; ComponentLink3Description: LCSC Part URL; ComponentLink3URL: https://lcsc.com/product-detail/Multilayer-Ceramic-Capacitors-MLCC---SMD-SMT_Samsung-Electro-Mechanics-Samsung-Electro-Mechanics-CL32B226MOJVPNE_C472859.html; ComponentLink4Description: Samsung Component Library; ComponentLink4URL: https://weblib.samsungsem.com/mlcc/mlcc-ec.do?partNumber=CL32B226MOJVPN
footprint CAP-1210 (1210 (3225M) Capacitor)
pins: 1, 2

## CL32B475KBJ4PNE
designator C?  Capacitance: 4.7uF  (hidden comment: *)
Capacitor, Ceramic (MLCC), 4.7uF, ±10%, 50V, X7R, ±10%, SMD 1210; Manufacturer: Samsung Electro-Mechanics; Manufacturer Part Number: CL32B475KBJ4PNE; Package Size: 1210; JLCPCB Basic Part: No; JLCPCB Part Number: C472860; Supplier 1: LCSC; Category: Capacitors - MLCC; Supplier Part Number 1: C472860; Tolerance: ±10%; Voltage Rating: 50V; Temperature Coefficient: X7R; RoHS: Yes; ComponentLink1Description: Datasheet; ComponentLink1URL: https://wmsc.lcsc.com/wmsc/upload/file/pdf/v2/lcsc/2304140030_Samsung-Electro-Mechanics-CL32B475KBJ4PNE_C472860.pdf; ComponentLink2Description: JLCPCB Part URL; ComponentLink2URL: https://jlcpcb.com/partdetail/C472860; ComponentLink3Description: LCSC Part URL; ComponentLink3URL: https://lcsc.com/product-detail/Multilayer-Ceramic-Capacitors-MLCC---SMD-SMT_Samsung-Electro-Mechanics-Samsung-Electro-Mechanics-CL32B475KBJ4PNE_C472860.html; ComponentLink4Description: Samsung Component Library; ComponentLink4URL: https://weblib.samsungsem.com/mlcc/mlcc-ec.do?partNumber=CL32B475KBJ4PN
footprint CAP-1210 (1210 (3225M) Capacitor)
pins: 1, 2

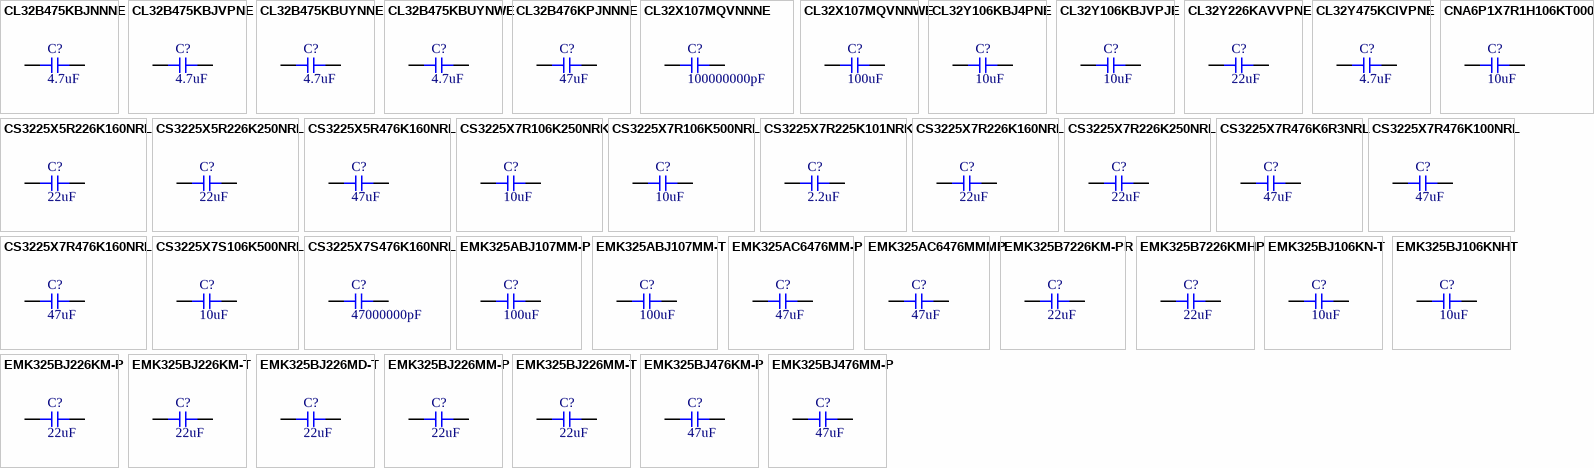
[diagram p10: symbols CL32B475KBJNNNE to EMK325BJ476MM-P]

## CL32B475KBJNNNE
designator C?  Capacitance: 4.7uF  (hidden comment: *)
Capacitor, Ceramic (MLCC), 4.7uF, ±10%, 50V, X7R, ±10%, SMD 1210; Manufacturer: Samsung Electro-Mechanics; Manufacturer Part Number: CL32B475KBJNNNE; Package Size: 1210; JLCPCB Basic Part: No; JLCPCB Part Number: C47783; Supplier 1: LCSC; Category: Capacitors - MLCC; Supplier Part Number 1: C47783; Tolerance: ±10%; Voltage Rating: 50V; Temperature Coefficient: X7R; RoHS: Yes; ComponentLink1Description: Datasheet; ComponentLink1URL: https://wmsc.lcsc.com/wmsc/upload/file/pdf/v2/lcsc/2304140030_Samsung-Electro-Mechanics-CL32B475KBJNNNE_C47783.pdf; ComponentLink2Description: JLCPCB Part URL; ComponentLink2URL: https://jlcpcb.com/partdetail/C47783; ComponentLink3Description: LCSC Part URL; ComponentLink3URL: https://lcsc.com/product-detail/Multilayer-Ceramic-Capacitors-MLCC---SMD-SMT_Samsung-Electro-Mechanics-Samsung-Electro-Mechanics-CL32B475KBJNNNE_C47783.html; ComponentLink4Description: Samsung Component Library; ComponentLink4URL: https://weblib.samsungsem.com/mlcc/mlcc-ec.do?partNumber=CL32B475KBJNNN
footprint CAP-1210 (1210 (3225M) Capacitor)
pins: 1, 2

## CL32B475KBJVPNE
designator C?  Capacitance: 4.7uF  (hidden comment: *)
Capacitor, Ceramic (MLCC), 4.7uF, ±10%, 50V, X7R, ±10%, SMD 1210; Manufacturer: Samsung Electro-Mechanics; Manufacturer Part Number: CL32B475KBJVPNE; Package Size: 1210; JLCPCB Basic Part: No; JLCPCB Part Number: C307373; Supplier 1: LCSC; Category: Capacitors - MLCC; Supplier Part Number 1: C307373; Tolerance: ±10%; Voltage Rating: 50V; Temperature Coefficient: X7R; RoHS: Yes; ComponentLink1Description: Datasheet; ComponentLink1URL: https://wmsc.lcsc.com/wmsc/upload/file/pdf/v2/lcsc/2304140030_Samsung-Electro-Mechanics-CL32B475KBJVPNE_C307373.pdf; ComponentLink2Description: JLCPCB Part URL; ComponentLink2URL: https://jlcpcb.com/partdetail/C307373; ComponentLink3Description: LCSC Part URL; ComponentLink3URL: https://lcsc.com/product-detail/Multilayer-Ceramic-Capacitors-MLCC---SMD-SMT_Samsung-Electro-Mechanics-Samsung-Electro-Mechanics-CL32B475KBJVPNE_C307373.html; ComponentLink4Description: Samsung Component Library; ComponentLink4URL: https://weblib.samsungsem.com/mlcc/mlcc-ec.do?partNumber=CL32B475KBJVPN
footprint CAP-1210 (1210 (3225M) Capacitor)
pins: 1, 2

## CL32B475KBUYNNE
designator C?  Capacitance: 4.7uF  (hidden comment: *)
Capacitor, Ceramic (MLCC), 4.7uF, ±10%, 50V, X7R, ±10%, SMD 1210; Manufacturer: Samsung Electro-Mechanics; Manufacturer Part Number: CL32B475KBUYNNE; Package Size: 1210; JLCPCB Basic Part: No; JLCPCB Part Number: C170099; Supplier 1: LCSC; Category: Capacitors - MLCC; Supplier Part Number 1: C170099; Tolerance: ±10%; Voltage Rating: 50V; Temperature Coefficient: X7R; RoHS: Yes; ComponentLink1Description: Datasheet; ComponentLink1URL: https://wmsc.lcsc.com/wmsc/upload/file/pdf/v2/lcsc/2304140030_Samsung-Electro-Mechanics-CL32B475KBUYNNE_C170099.pdf; ComponentLink2Description: JLCPCB Part URL; ComponentLink2URL: https://jlcpcb.com/partdetail/C170099; ComponentLink3Description: LCSC Part URL; ComponentLink3URL: https://lcsc.com/product-detail/Multilayer-Ceramic-Capacitors-MLCC---SMD-SMT_Samsung-Electro-Mechanics-Samsung-Electro-Mechanics-CL32B475KBUYNNE_C170099.html; ComponentLink4Description: Samsung Component Library; ComponentLink4URL: https://weblib.samsungsem.com/mlcc/mlcc-ec.do?partNumber=CL32B475KBUYNN
footprint CAP-1210 (1210 (3225M) Capacitor)
pins: 1, 2

## CL32B475KBUYNWE
designator C?  Capacitance: 4.7uF  (hidden comment: *)
Capacitor, Ceramic (MLCC), 4.7uF, 50V, X7R, SMD 1210; Manufacturer: Samsung Electro-Mechanics; Manufacturer Part Number: CL32B475KBUYNWE; Package Size: 1210; JLCPCB Basic Part: No; JLCPCB Part Number: C2976071; Supplier 1: LCSC; Category: Capacitors - MLCC; Supplier Part Number 1: C2976071; Voltage Rating: 50V; Temperature Coefficient: X7R; RoHS: Yes; ComponentLink1Description: Datasheet; ComponentLink1URL: https://wmsc.lcsc.com/wmsc/upload/file/pdf/v2/lcsc/2202221130_Samsung-Electro-Mechanics-CL32B475KBUYNWE_C2976071.pdf; ComponentLink2Description: JLCPCB Part URL; ComponentLink2URL: https://jlcpcb.com/partdetail/C2976071; ComponentLink3Description: LCSC Part URL; ComponentLink3URL: https://lcsc.com/product-detail/Multilayer-Ceramic-Capacitors-MLCC---SMD-SMT_Samsung-Electro-Mechanics-Samsung-Electro-Mechanics-CL32B475KBUYNWE_C2976071.html; ComponentLink4Description: Samsung Component Library; ComponentLink4URL: https://weblib.samsungsem.com/mlcc/mlcc-ec.do?partNumber=CL32B475KBUYNW
footprint CAP-1210 (1210 (3225M) Capacitor)
pins: 1, 2

## CL32B476KPJNNNE
designator C?  Capacitance: 47uF  (hidden comment: *)
Capacitor, Ceramic (MLCC), 47uF, ±10%, 10V, X7R, ±10%, SMD 1210; Manufacturer: Samsung Electro-Mechanics; Manufacturer Part Number: CL32B476KPJNNNE; Package Size: 1210; JLCPCB Basic Part: No; JLCPCB Part Number: C2932478; Supplier 1: LCSC; Category: Capacitors - MLCC; Supplier Part Number 1: C2932478; Tolerance: ±10%; Voltage Rating: 10V; Temperature Coefficient: X7R; RoHS: Yes; ComponentLink1Description: Datasheet; ComponentLink1URL: https://wmsc.lcsc.com/wmsc/upload/file/pdf/v2/lcsc/2201121530_Samsung-Electro-Mechanics-CL32B476KPJNNNE_C2932478.pdf; ComponentLink2Description: JLCPCB Part URL; ComponentLink2URL: https://jlcpcb.com/partdetail/C2932478; ComponentLink3Description: LCSC Part URL; ComponentLink3URL: https://lcsc.com/product-detail/Multilayer-Ceramic-Capacitors-MLCC---SMD-SMT_Samsung-Electro-Mechanics-Samsung-Electro-Mechanics-CL32B476KPJNNNE_C2932478.html; ComponentLink4Description: Samsung Component Library; ComponentLink4URL: https://weblib.samsungsem.com/mlcc/mlcc-ec.do?partNumber=CL32B476KPJNNN
footprint CAP-1210 (1210 (3225M) Capacitor)
pins: 1, 2
